# Altium footprint library my Library.PcbLib: 1247 footprints (part 2 of 78)
Each footprint in its own frame and in the unit in brackets; x right, y up, seen from the top. Pads: shape width x height; smd on the part's side, far side on the other; paste and mask are expansions set on the pad; w line width, h text height; cw(c..) or ccw(c..) is an arc to the next point about the centre after c.
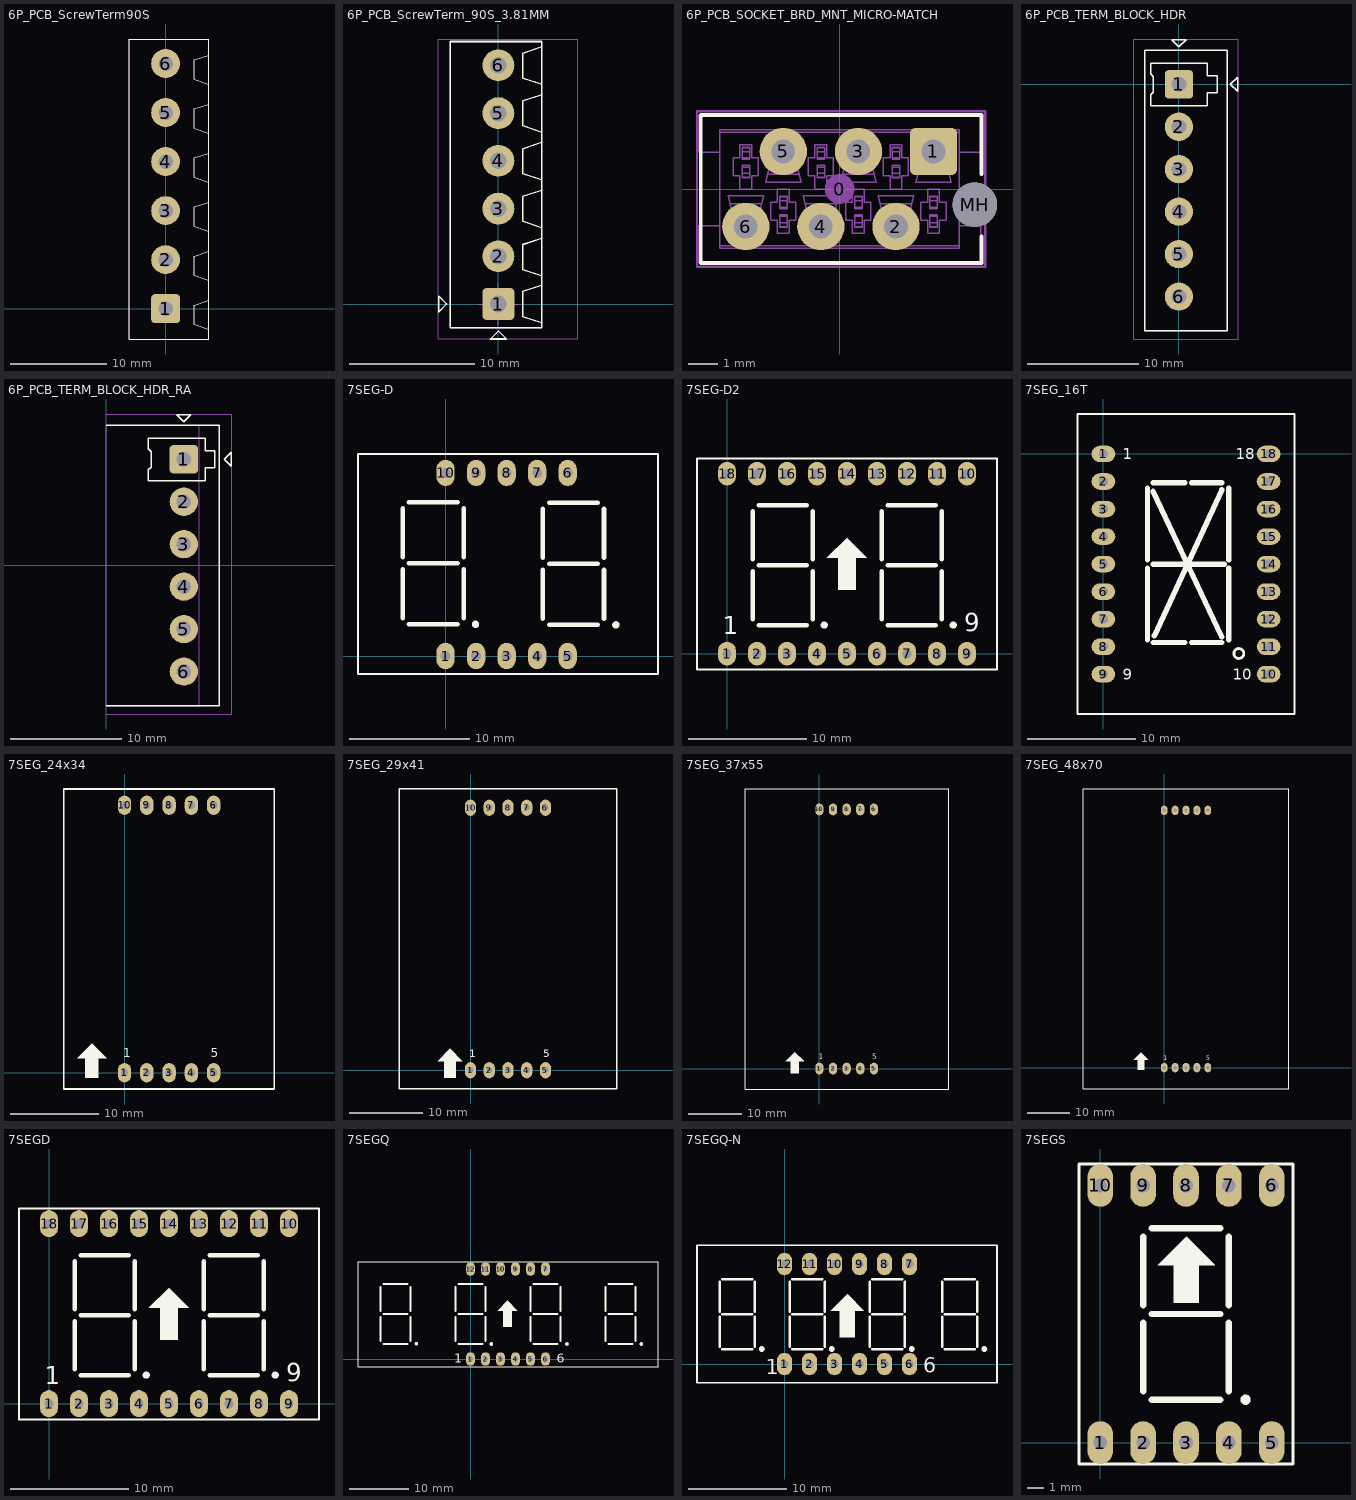
[diagram p1: the footprints below, top view; thin cyan lines are the x and y axes]

## 6P_PCB_ScrewTerm90S [mm] "TERM BLOCK 6POS SIDE ENT STACKABLE 5.08MM"
height 10
pads (6):
  rrect25% 3x3 hole 1.5: 1(0,0)
  round 3 hole 1.5: 2(0,5.08) 3(0,10.16) 4(0,15.24) 5(0,20.32) 6(0,25.4)
Top Overlay:
  lines w0.127: 4.45,-2.124 2.95,-1.624 2.95,0.376 4.45,0.876 ; 4.45,2.956 2.95,3.456 2.95,5.456 4.45,5.956 ; 4.45,8.036 2.95,8.536 2.95,10.536 4.45,11.036 ; 4.45,13.116 2.95,13.616 2.95,15.616 4.45,16.116 ; 4.45,18.196 2.95,18.696 2.95,20.696 4.45,21.196 ; 4.45,23.276 2.95,23.776 2.95,25.776 4.45,26.276 ; -3.75,-3.14 4.45,-3.14 4.45,27.94 -3.75,27.94 -3.75,-3.14
Mechanical 13:
  lines w0.076: -3.75,-3.14 4.45,-3.14 4.45,27.94 -3.75,27.94 -3.75,-3.14
3D body "c-1776119-6-b-3d.stp": height 10.02, standoff -2.58, extent -3.75,-3.14 4.45,27.94

## 6P_PCB_ScrewTerm_90S_3.81MM [mil] "TERM BLOCK 6POS SIDE ENT STACKABLE 3.81MM"
height 334.65
pads (6):
  rrect25% 100x100 hole 52: 1(0,0)
  round 100 hole 52: 2(0,150) 3(0,300) 4(0,450) 5(0,600) 6(0,750)
Top Overlay:
  lines w5: 135.83,-59.06 76.78,-39.37 76.78,39.37 135.83,59.06 ; 135.83,88.58 76.78,108.27 76.78,187.01 135.83,206.69 ; 135.83,240 76.78,259.69 76.78,338.43 135.83,358.11 ; 135.83,390 76.78,409.69 76.78,488.43 135.83,508.11 ; 135.83,540 76.78,559.68 76.78,638.43 135.83,658.11 ; 135.83,690 76.78,709.68 76.78,788.43 135.83,808.11 ; -188,-25 -163,0 -188,25 -188,-25 ; -151.57,-75 -151.57,825 135.83,825 135.83,-75 -151.57,-75 ; -25,-110 25,-110 0,-85 -25,-110
Mechanical 13:
  lines w3: -151.57,-75 135.83,-75 135.83,825 -151.57,825 -151.57,-75
Mechanical 15:
  lines w3: -65,0 65,0 ; 0,-65 0,65 ; -190,-110 -190,832.88 250,832.88 250,-110 -190,-110
3D body "c-1776113-6-o-3d.stp": height 335.25, standoff -137.2, extent -151.57,-75 135.83,825

## 6P_PCB_SOCKET_BRD_MNT_MICRO-MATCH [mm] "SOCKET MICRO-MATCH BRD MNT 6POS 2.54MM"
height 4.2
pads (8):
  round 1.016 on Mech15: 0(0,0)
  rrect25% 1.6x1.6 hole 0.8: 1(3.175,1.27)
  round 1.6 hole 0.8: 2(1.905,-1.27) 3(0.635,1.27) 4(-0.635,-1.27) 5(-1.905,1.27) 6(-3.175,-1.27)
  round 1.5 hole 1.5 unplated: MH(4.575,-0.53)
Top Overlay:
  lines w0.127: 4.8,-1.6 4.8,-2.5 -4.7,-2.5 -4.7,2.5 4.8,2.5 4.8,0.5
Mechanical 13:
  drawing of 280 lines, arcs and shapes, not listed
Mechanical 15:
  lines w0.076: -4.827,-2.627 4.927,-2.627 4.927,2.627 -4.827,2.627 -4.827,-2.627
3D body "Micro-Match 6-pin header 7-215079-6.STEP": height 4, standoff -3, extent -4.775,-2.5 4.775,2.5

## 6P_PCB_TERM_BLOCK_HDR [mil] "TERM BLOCK HDR 6POS 3.81MM"
height 362.2
pads (6):
  rrect25% 100x100 hole 52: 1(0,0)
  round 100 hole 52: 2(0,-150) 3(0,-300) 4(0,-450) 5(0,-600) 6(0,-750)
Top Overlay:
  lines w5: -120,-870 170,-870 170,120 -120,120 -120,-870 ; -100,-75 100,-75 100,-30 135,-30 135,30 100,30 100,75 -100,75 -100,37.5 -90,27.5 -90,-27.5 -100,-37.5 -100,-75 ; -25,157 0,132 25,157 -25,157 ; 182,0 207,25 207,-25 182,0
Mechanical 13:
  lines w3: -120,-870 -120,120 170,120 170,-870 -120,-870
Mechanical 15:
  lines w3: -160,-900 210,-900 210,160 -160,160 -160,-900
3D body "c-0284517-06-c-3d.stp": height 362.8, standoff -133.26, extent -118.11,-870.07 167.33,120.08
3D body: height 362.2, standoff 0, extent -120,-870 170,120

## 6P_PCB_TERM_BLOCK_HDR_RA [mil] "TERM BLOCK HDR 6POS 3.81MM RIGHT-ANGLE"
height 362.2
pads (6):
  rrect25% 100x100 hole 52: 1(275,375)
  round 100 hole 52: 2(275,225) 3(275,75) 4(275,-75) 5(275,-225) 6(275,-375)
Top Overlay:
  lines w5: 0,-495 400,-495 400,495 0,495 ; 150,300 350,300 350,345 385,345 385,405 350,405 350,450 150,450 150,412.5 160,402.5 160,347.5 150,337.5 150,300 ; 250,532 275,507 300,532 250,532 ; 417,375 442,400 442,350 417,375
Mechanical 13:
  lines w3: 0,-495 0,495 330,495 330,-495 0,-495
Mechanical 15:
  lines w3: 0,-525 445,-525 445,535 0,535
3D body "c-284513-6-c-3d.stp": height 288, standoff -133.26, extent -40,-495.08 322.2,495.08

## 7SEG-D [mil] "DIP 10 Leads; Body 25 x 19 mm; Pitch 0.5 mm"
height 300
pads (10):
  oval 60x86 hole 32: 1(0,0) 2(100,0) 3(200,0) 4(300,0) 5(400,0) 6(400,600) 7(300,600) 8(200,600) 9(100,600) 10(0,600)
Top Overlay:
  circle w12: c98,104 r6
  circle w12: c558,102 r6
  lines w7: -287,-59 -287,662 696,662 696,-59 -287,-59
  lines w15: -141,124 -141,284 ; -141,124 -141,284 ; -141,124 -141,284 ; -141,124 -141,284 ; -141,124 -141,284 ; -141,124 -141,284 ; -141,124 -141,284 ; -141,124 -141,284 ; -141,324 -141,484 ; -141,324 -141,484 ; -141,324 -141,484 ; -141,324 -141,484 ; -141,324 -141,484 ; -141,324 -141,484 ; -141,324 -141,484 ; -141,324 -141,484 ; -121,104 39,104 ; -121,104 39,104 ; -121,104 39,104 ; -121,104 39,104 ; -121,304 39,304 ; -121,304 39,304 ; -121,304 39,304 ; -121,304 39,304 ; -121,304 39,304 ; -121,304 39,304 ; -121,304 39,304 ; -121,304 39,304 ; -121,504 39,504 ; -121,504 39,504 ; -121,504 39,504 ; -121,504 39,504 ; 59,124 59,284 ; 59,124 59,284 ; 59,124 59,284 ; 59,124 59,284 ; 59,124 59,284 ; 59,124 59,284 ; 59,124 59,284 ; 59,124 59,284 ; 59,324 59,484 ; 59,324 59,484 ; 59,324 59,484 ; 59,324 59,484 ; 59,324 59,484 ; 59,324 59,484 ; 59,324 59,484 ; 59,324 59,484 ; 319,122 319,282 ; 319,122 319,282 ; 319,122 319,282 ; 319,122 319,282 ; 319,122 319,282 ; 319,122 319,282 ; 319,122 319,282 ; 319,122 319,282 ; 319,322 319,482 ; 319,322 319,482 ; 319,322 319,482 ; 319,322 319,482 ; 319,322 319,482 ; 319,322 319,482 ; 319,322 319,482 ; 319,322 319,482 ; 339,102 499,102 ; 339,102 499,102 ; 339,102 499,102 ; 339,102 499,102 ; 339,302 499,302 ; 339,302 499,302 ; 339,302 499,302 ; 339,302 499,302 ; 339,302 499,302 ; 339,302 499,302 ; 339,302 499,302 ; 339,302 499,302 ; 339,502 499,502 ; 339,502 499,502 ; 339,502 499,502 ; 339,502 499,502 ; 519,122 519,282 ; 519,122 519,282 ; 519,122 519,282 ; 519,122 519,282 ; 519,122 519,282 ; 519,122 519,282 ; 519,122 519,282 ; 519,122 519,282 ; 519,322 519,482 ; 519,322 519,482 ; 519,322 519,482 ; 519,322 519,482 ; 519,322 519,482 ; 519,322 519,482 ; 519,322 519,482 ; 519,322 519,482

## 7SEG-D2 [mm] "DIP 18Leads; Body 24 x 15 mm; Pitch 0.5 mm"
height 7.62
pads (18):
  oval 1.524x2 hole 0.8 paste+0: 1(0,0) 2(2.54,0) 3(5.08,0) 5(10.16,0) 6(12.7,0) 7(15.24,0) 8(17.78,0) 9(20.32,0) 10(20.32,15.24) 11(17.78,15.24) 12(15.24,15.24) 13(12.7,15.24) 14(10.16,15.24) 15(7.62,15.24) 16(5.08,15.24) 17(2.54,15.24) 18(0,15.24)
  oval 1.524x2 hole 0.8: 4(7.62,0)
Top Overlay:
  circle w0.305: c8.23,2.413 r0.152
  circle w0.305: c19.152,2.413 r0.152
  region: 8.458,8.103 10.135,9.779 10.185,9.779 11.836,8.128 11.836,8.103 10.897,8.103 10.897,5.41 9.398,5.41 9.398,8.103
  lines w0.178: -2.54,-1.333 -2.54,16.51 ; -2.54,-1.333 -2.54,16.51 ; -2.54,-1.333 -2.54,16.51 ; -2.54,-1.333 -2.54,16.51 ; -2.54,16.51 22.86,16.51 ; -2.54,16.51 22.86,16.51 ; -2.54,16.51 22.86,16.51 ; -2.54,16.51 22.86,16.51 ; 22.86,-1.333 22.86,16.51 ; 22.86,-1.333 22.86,16.51 ; 22.86,-1.333 -2.54,-1.321 22.86,-1.333 ; 22.86,-1.333 22.86,16.51 ; 22.86,-1.333 22.86,16.51
  lines w0.381: 2.159,2.921 2.159,6.985 ; 2.159,2.921 2.159,6.985 ; 2.159,2.921 2.159,6.985 ; 2.159,2.921 2.159,6.985 ; 2.159,2.921 2.159,6.985 ; 2.159,2.921 2.159,6.985 ; 2.159,2.921 2.159,6.985 ; 2.159,2.921 2.159,6.985 ; 2.159,8.001 2.159,12.065 ; 2.159,8.001 2.159,12.065 ; 2.159,8.001 2.159,12.065 ; 2.159,8.001 2.159,12.065 ; 2.159,8.001 2.159,12.065 ; 2.159,8.001 2.159,12.065 ; 2.159,8.001 2.159,12.065 ; 2.159,8.001 2.159,12.065 ; 2.667,2.413 6.731,2.413 ; 2.667,2.413 6.731,2.413 ; 2.667,2.413 6.731,2.413 ; 2.667,2.413 6.731,2.413 ; 2.667,7.493 6.731,7.493 ; 2.667,7.493 6.731,7.493 ; 2.667,7.493 6.731,7.493 ; 2.667,7.493 6.731,7.493 ; 2.667,7.493 6.731,7.493 ; 2.667,7.493 6.731,7.493 ; 2.667,7.493 6.731,7.493 ; 2.667,7.493 6.731,7.493 ; 2.667,12.573 6.731,12.573 ; 2.667,12.573 6.731,12.573 ; 2.667,12.573 6.731,12.573 ; 2.667,12.573 6.731,12.573 ; 7.239,2.921 7.239,6.985 ; 7.239,2.921 7.239,6.985 ; 7.239,2.921 7.239,6.985 ; 7.239,2.921 7.239,6.985 ; 7.239,2.921 7.239,6.985 ; 7.239,2.921 7.239,6.985 ; 7.239,2.921 7.239,6.985 ; 7.239,2.921 7.239,6.985 ; 7.239,8.001 7.239,12.065 ; 7.239,8.001 7.239,12.065 ; 7.239,8.001 7.239,12.065 ; 7.239,8.001 7.239,12.065 ; 7.239,8.001 7.239,12.065 ; 7.239,8.001 7.239,12.065 ; 7.239,8.001 7.239,12.065 ; 7.239,8.001 7.239,12.065 ; 13.081,2.921 13.081,6.985 ; 13.081,2.921 13.081,6.985 ; 13.081,2.921 13.081,6.985 ; 13.081,2.921 13.081,6.985 ; 13.081,2.921 13.081,6.985 ; 13.081,2.921 13.081,6.985 ; 13.081,2.921 13.081,6.985 ; 13.081,2.921 13.081,6.985 ; 13.081,8.001 13.081,12.065 ; 13.081,8.001 13.081,12.065 ; 13.081,8.001 13.081,12.065 ; 13.081,8.001 13.081,12.065 ; 13.081,8.001 13.081,12.065 ; 13.081,8.001 13.081,12.065 ; 13.081,8.001 13.081,12.065 ; 13.081,8.001 13.081,12.065 ; 13.589,2.413 17.653,2.413 ; 13.589,2.413 17.653,2.413 ; 13.589,2.413 17.653,2.413 ; 13.589,2.413 17.653,2.413 ; 13.589,7.493 17.653,7.493 ; 13.589,7.493 17.653,7.493 ; 13.589,7.493 17.653,7.493 ; 13.589,7.493 17.653,7.493 ; 13.589,7.493 17.653,7.493 ; 13.589,7.493 17.653,7.493 ; 13.589,7.493 17.653,7.493 ; 13.589,7.493 17.653,7.493 ; 13.589,12.573 17.653,12.573 ; 13.589,12.573 17.653,12.573 ; 13.589,12.573 17.653,12.573 ; 13.589,12.573 17.653,12.573 ; 18.161,2.921 18.161,6.985 ; 18.161,2.921 18.161,6.985 ; 18.161,2.921 18.161,6.985 ; 18.161,2.921 18.161,6.985 ; 18.161,2.921 18.161,6.985 ; 18.161,2.921 18.161,6.985 ; 18.161,2.921 18.161,6.985 ; 18.161,2.921 18.161,6.985 ; 18.161,8.001 18.161,12.065 ; 18.161,8.001 18.161,12.065 ; 18.161,8.001 18.161,12.065 ; 18.161,8.001 18.161,12.065 ; 18.161,8.001 18.161,12.065 ; 18.161,8.001 18.161,12.065 ; 18.161,8.001 18.161,12.065 ; 18.161,8.001 18.161,12.065
  text "9" at 20.066,1.905 h1.52
  text "1" at -0.356,1.651 h1.52

## 7SEG_16T [mil] "DIP 10 Leads; Body 24 x 34 mm; Pitch 0.5 mm"
height 300
pads (18):
  oval 86x60 hole 32: 1(0,0) 2(0,-100) 3(0,-200) 4(0,-300) 5(0,-400) 6(0,-500) 7(0,-600) 8(0,-700) 9(0,-800) 10(600,-800) 11(600,-700) 12(600,-600) 13(600,-500) 14(600,-400) 15(600,-300) 16(600,-200) 17(600,-100) 18(600,0)
Top Overlay:
  circle w10: c491.97,-725 r18.03
  lines w7: -93.7,-944.88 693.7,-944.88 693.7,145.28 -93.7,145.28 -93.7,-940.55
  lines w19.68: 160,-675 160,-415 ; 160,-385 160,-125 ; 180,-685 295,-685 ; 180,-400 440,-400 ; 180,-135 430,-665 ; 180,-105 295,-105 ; 185,-660 430,-130 ; 320,-685 430,-685 ; 320,-105 430,-105 ; 455,-675 455,-415 ; 455,-385 455,-125
  text "18" at 480,-20 h40
  text "10" at 470,-820 h40
  text "1" at 70,-20 h40
  text "9" at 70,-820 h40

## 7SEG_24x34 [mil] "DIP 10 Leads; Body 24 x 34 mm; Pitch 0.5 mm"
height 300
pads (10):
  oval 60x86 hole 32: 1(0,0) 2(100,0) 3(200,0) 4(300,0) 5(400,0) 6(400,1200) 7(300,1200) 8(200,1200) 9(100,1200) 10(0,1200)
Top Overlay:
  region: -213,65 -147,131 -145,131 -80,66 -80,65 -117,65 -117,-23 -176,-23 -176,65
  lines w7: -273,-73 672,-73 672,1273 -273,1273 -273,-73
  text "1" at -6.66,69 h40
  text "5" at 386.67,69 h40

## 7SEG_29x41 [mil] "DIP 10 Leads; Body 29 x 41 mm; Pitch 0.5 mm"
height 300
pads (10):
  oval 60x86 hole 32: 1(0,0) 2(100,0) 3(200,0) 4(300,0) 5(400,0) 6(400,1400) 7(300,1400) 8(200,1400) 9(100,1400) 10(0,1400)
Top Overlay:
  region: -176,48 -110,114 -108,114 -43,49 -43,48 -80,48 -80,-40 -139,-40 -139,48
  lines w7: -380,-100 -380,1500 780,1500 780,-100 -380,-100
  text "1" at -5.66,69 h40
  text "5" at 387.67,69 h40

## 7SEG_37x55 [mil] "DIP 10 Leads; Body 29 x 41 mm; Pitch 0.5 mm"
height 300
pads (10):
  oval 60x86 hole 32: 1(0,0) 2(100,0) 3(200,0) 4(300,0) 5(400,0) 6(400,1900) 7(300,1900) 8(200,1900) 9(100,1900) 10(0,1900)
Top Overlay:
  region: -248,55 -182,121 -180,121 -115,56 -115,55 -152,55 -152,-33 -211,-33 -211,55
  lines w7: -545,-150 950,-150 950,2050 -545,2050 -545,-150
  text "5" at 387.67,67 h40
  text "1" at -5.66,67 h40

## 7SEG_48x70 [mm] "DIP 10 Leads; Body 47,76 x 70mm; Pitch 0.5 mm"
height 7.62
pads (10):
  oval 1.6x2.2 hole 0.813: 1(0,0) 2(2.54,0) 3(5.08,0) 4(7.62,0) 5(10.16,0) 6(10.16,60) 7(7.62,60) 8(5.08,60) 9(2.54,60) 10(0,60)
Top Overlay:
  region: -7.112,1.778 -5.436,3.454 -5.385,3.454 -3.734,1.803 -3.734,1.778 -4.674,1.778 -4.674,-0.457 -6.172,-0.457 -6.172,1.778
  lines w0.178: -18.92,65 29.08,65 ; -18.92,-5 29.08,-5 -18.92,-5
  lines w0.203: -18.923,-4.928 -18.923,64.999 ; 29.058,-4.928 29.058,64.999
  text "5" at 9.847,1.702 h1.02
  text "1" at -0.144,1.702 h1.02

## 7SEGD [mil] "DIP 18Leads; Body 24 x 15 mm; Pitch 0.5 mm"
height 300
pads (18):
  oval 60x90 hole 31 paste+0: 1(0,0) 2(100,0) 3(200,0) 5(400,0) 6(500,0) 7(600,0) 8(700,0) 9(800,0) 10(800,600) 11(700,600) 12(600,600) 13(500,600) 14(400,600) 15(300,600) 16(200,600) 17(100,600) 18(0,600)
  oval 60x90 hole 31: 4(300,0)
Top Overlay:
  circle w12: c324,95 r6
  circle w12: c754,95 r6
  region: 333,319 399,385 401,385 466,320 466,319 429,319 429,213 370,213 370,319
  lines w7: -100,-52.5 -100,650 ; -100,-52.5 -100,650 ; -100,-52.5 -100,650 ; -100,-52.5 -100,650 ; -100,650 900,650 ; -100,650 900,650 ; -100,650 900,650 ; -100,650 900,650 ; 900,-52.5 900,650 ; 900,-52.5 900,650 ; 900,-52.5 -100,-52 900,-52.5 ; 900,-52.5 900,650 ; 900,-52.5 900,650
  lines w15: 85,115 85,275 ; 85,115 85,275 ; 85,115 85,275 ; 85,115 85,275 ; 85,115 85,275 ; 85,115 85,275 ; 85,115 85,275 ; 85,115 85,275 ; 85,315 85,475 ; 85,315 85,475 ; 85,315 85,475 ; 85,315 85,475 ; 85,315 85,475 ; 85,315 85,475 ; 85,315 85,475 ; 85,315 85,475 ; 105,95 265,95 ; 105,95 265,95 ; 105,95 265,95 ; 105,95 265,95 ; 105,295 265,295 ; 105,295 265,295 ; 105,295 265,295 ; 105,295 265,295 ; 105,295 265,295 ; 105,295 265,295 ; 105,295 265,295 ; 105,295 265,295 ; 105,495 265,495 ; 105,495 265,495 ; 105,495 265,495 ; 105,495 265,495 ; 285,115 285,275 ; 285,115 285,275 ; 285,115 285,275 ; 285,115 285,275 ; 285,115 285,275 ; 285,115 285,275 ; 285,115 285,275 ; 285,115 285,275 ; 285,315 285,475 ; 285,315 285,475 ; 285,315 285,475 ; 285,315 285,475 ; 285,315 285,475 ; 285,315 285,475 ; 285,315 285,475 ; 285,315 285,475 ; 515,115 515,275 ; 515,115 515,275 ; 515,115 515,275 ; 515,115 515,275 ; 515,115 515,275 ; 515,115 515,275 ; 515,115 515,275 ; 515,115 515,275 ; 515,315 515,475 ; 515,315 515,475 ; 515,315 515,475 ; 515,315 515,475 ; 515,315 515,475 ; 515,315 515,475 ; 515,315 515,475 ; 515,315 515,475 ; 535,95 695,95 ; 535,95 695,95 ; 535,95 695,95 ; 535,95 695,95 ; 535,295 695,295 ; 535,295 695,295 ; 535,295 695,295 ; 535,295 695,295 ; 535,295 695,295 ; 535,295 695,295 ; 535,295 695,295 ; 535,295 695,295 ; 535,495 695,495 ; 535,495 695,495 ; 535,495 695,495 ; 535,495 695,495 ; 715,115 715,275 ; 715,115 715,275 ; 715,115 715,275 ; 715,115 715,275 ; 715,115 715,275 ; 715,115 715,275 ; 715,115 715,275 ; 715,115 715,275 ; 715,315 715,475 ; 715,315 715,475 ; 715,315 715,475 ; 715,315 715,475 ; 715,315 715,475 ; 715,315 715,475 ; 715,315 715,475 ; 715,315 715,475
  text "9" at 790,75 h60
  text "1" at -14,65 h60
3D body "SW3dPS-atd-036ab.STEP": height 283.66, standoff -120, extent -24.88,30 864.88,585.12

## 7SEGQ [mil] "DIP 12 Leads; Body 48 x 20 mm; Pitch 0.5 mm"
height 300
pads (12):
  oval 60x90 hole 31: 1(0,0) 2(100,0) 3(200,0) 4(300,0) 5(400,0) 6(500,0) 7(500,600) 8(400,600) 9(300,600) 10(200,600) 11(100,600) 12(0,600)
Top Overlay:
  drawing of 155 lines, arcs and shapes, not listed
  text "6" at 575,-26 h60
  text "1" at -108,-24 h60
3D body "SOCKET6.stp": height 276.19, standoff -117.51, extent -50,550 550,650
3D body "SOCKET6.stp": height 276.19, standoff -117.51, extent -50,-44.99 550,55.01
3D body "7seg2-4.STEP": height 564.96, standoff 112.2, extent -720.16,-80 1260.16,668.03

## 7SEGQ-N [mil] "DIP 12 Leads; Body 32x 15 mm; Pitch 0.5 mm"
height 300
pads (12):
  oval 60x90 hole 31: 1(0,0) 2(100,0) 3(200,0) 4(300,0) 5(400,0) 6(500,0) 7(500,400) 8(400,400) 9(300,400) 10(200,400) 11(100,400) 12(0,400)
Top Overlay:
  circle w12: c509,60 r6
  circle w12: c799,60 r6
  circle w12: c-91,60 r6
  circle w12: c189,60 r6
  region: 184,213 250,279 252,279 317,214 317,213 280,213 280,107 221,107 221,213
  lines w7: -350,-75 -350,475 850,475 850,-75 -350,-75
  lines w10: -260,70 -260,190 ; -260,210 -260,330 ; -250,60 -130,60 ; -250,340 -130,340 ; -120,70 -120,190 ; -120,210 -120,330 ; 20,70 20,190 ; 20,210 20,330 ; 30,60 150,60 ; 30,340 150,340 ; 160,70 160,190 ; 160,210 160,330 ; 340,70 340,190 ; 340,210 340,330 ; 350,60 470,60 ; 350,340 470,340 ; 480,70 480,190 ; 480,210 480,330 ; 630,70 630,190 ; 630,210 630,330 ; 640,60 760,60 ; 640,340 760,340 ; 770,70 770,190 ; 770,210 770,330 ; -250,200 -130,200 -250,200 ; 30,200 150,200 30,200 ; 350,200 470,200 350,200 ; 640,200 760,200 640,200
  text "1" at -75,-40 h60
  text "6" at 555,-35 h60
3D body "SW3dPS-LTC-3710HR DISPLAY, 4-LED.STEP": height 238, standoff -98, extent -335.5,-70 865.5,450

## 7SEGS [mil] "DIP 10 Leads; Body 12 x 15 mm; Pitch 0.5 mm"
height 300
pads (10):
  oval 60x100 hole 32: 1(0,0) 2(100,0) 3(200,0) 4(300,0) 5(400,0) 6(400,600) 7(300,600) 8(200,600) 9(100,600) 10(0,600)
Top Overlay:
  circle w12: c339,100 r6
  region: 134,414 200,480 202,480 267,415 267,414 230,414 230,326 171,326 171,414
  lines w7: -50,-50 450,-50 450,650 -50,650 -50,-50
  lines w15: 100,120 100,280 ; 100,120 100,280 ; 100,120 100,280 ; 100,120 100,280 ; 100,120 100,280 ; 100,120 100,280 ; 100,120 100,280 ; 100,120 100,280 ; 100,320 100,480 ; 100,320 100,480 ; 100,320 100,480 ; 100,320 100,480 ; 100,320 100,480 ; 100,320 100,480 ; 100,320 100,480 ; 100,320 100,480 ; 120,100 280,100 ; 120,100 280,100 ; 120,100 280,100 ; 120,100 280,100 ; 120,300 280,300 ; 120,300 280,300 ; 120,300 280,300 ; 120,300 280,300 ; 120,300 280,300 ; 120,300 280,300 ; 120,300 280,300 ; 120,300 280,300 ; 120,500 280,500 ; 120,500 280,500 ; 120,500 280,500 ; 120,500 280,500 ; 300,120 300,280 ; 300,120 300,280 ; 300,120 300,280 ; 300,120 300,280 ; 300,120 300,280 ; 300,120 300,280 ; 300,120 300,280 ; 300,120 300,280 ; 300,320 300,480 ; 300,320 300,480 ; 300,320 300,480 ; 300,320 300,480 ; 300,320 300,480 ; 300,320 300,480 ; 300,320 300,480 ; 300,320 300,480
3D body "SW3dPS-Disp_SA56-11.STEP": height 316.25, standoff -156.19, extent -50,-75 450,675